# Altium footprint library thu vien thong.PcbLib: 106 footprints (part 4 of 7)
Each footprint in its own frame and in the unit in brackets; x right, y up, seen from the top. Pads: shape width x height; smd on the part's side, far side on the other; paste and mask are expansions set on the pad; w line width, h text height; cw(c..) or ccw(c..) is an arc to the next point about the centre after c.
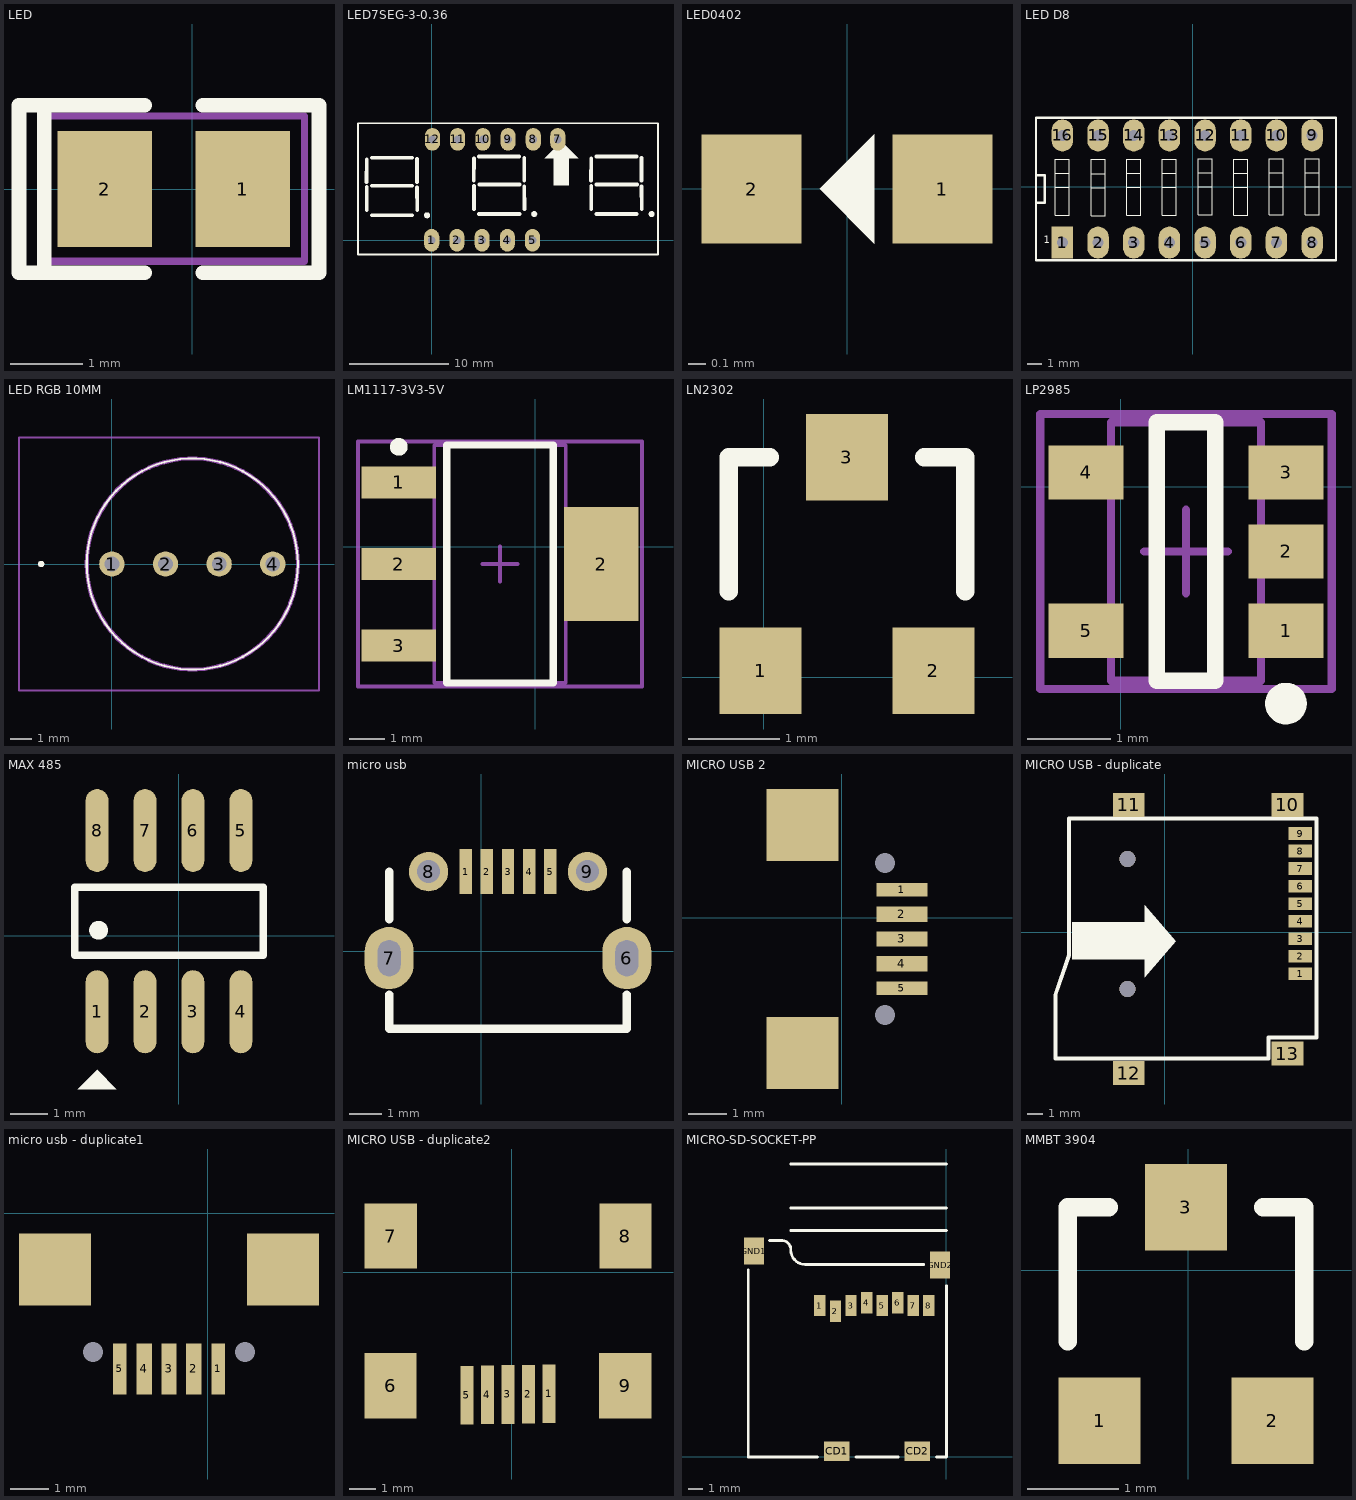
[diagram p3: the footprints below, top view; thin cyan lines are the x and y axes]

## LED [mm]
pads (2):
  rect 1.3x1.6 smd: 1(0.694,0.006) 2(-1.206,0.006)
Top Overlay:
  lines w0.2: -2.036,-1.144 -2.036,1.156 ; -0.656,-1.144 -2.386,-1.144 -2.386,1.156 -0.656,1.156 ; 0.144,-1.144 1.744,-1.144 1.744,1.156 0.144,1.156
Mechanical 13:
  lines w0.1: -2.057,-0.991 -2.057,1.009 1.543,1.009 1.543,-0.991 -2.057,-0.991
3D body: height 1.14, standoff 0.61, extent -0.953,-0.635 0.445,0.635
3D body: height 0.61, standoff 0, extent -1.333,-0.635 0.826,0.635

## LED7SEG-3-0.36 [mil]
height 300
pads (11):
  oval 60x90 hole 31: 1(0,0) 2(100,0) 3(200,0) 4(300,0) 5(400,0) 7(500,400) 8(402.95,400) 9(302.95,400) 10(202.95,400) 11(102.95,400) 12(2.95,400)
Top Overlay:
  circle w12: c872.27,103.94 r6
  circle w12: c-18.48,99.02 r6
  circle w12: c406.72,103.94 r6
  region: 447.72,324.94 513.72,390.94 515.72,390.94 580.72,325.94 580.72,324.94 543.72,324.94 543.72,218.94 484.72,218.94 484.72,324.94
  lines w7: -292.32,-57.09 -292.32,463.58 897.64,463.58
  lines w7.01: -292.32,-57.09 897.64,-57.09 897.64,463.58
  lines w15: -258.46,231.42 -257.87,319.88 ; -237.76,326.77 -77.76,326.77 ; -236.77,216.54 -76.77,216.54 ; -58.46,231.42 -58.07,321.85 ; 166.73,236.34 167.32,324.8 ; 187.44,331.69 347.44,331.69 ; 188.43,221.46 348.43,221.46 ; 366.73,236.34 367.13,326.77 ; 632.28,236.34 632.87,324.8 ; 652.99,331.69 812.99,331.69 ; 653.98,221.46 813.98,221.46 ; 832.28,236.34 832.68,326.77 ; -257.48,119.02 -257.48,210.63 ; -257.48,119.02 -257.48,210.63 ; -257.48,119.02 -257.48,210.63 ; -257.48,119.02 -257.48,210.63 ; -58.07,209.65 -57.48,119.02 ; -58.07,209.65 -57.48,119.02 ; -58.07,209.65 -57.48,119.02 ; -58.07,209.65 -57.48,119.02 ; 167.72,123.94 167.72,215.55 ; 167.72,123.94 167.72,215.55 ; 167.72,123.94 167.72,215.55 ; 167.72,123.94 167.72,215.55 ; 367.13,214.57 367.72,123.94 ; 367.13,214.57 367.72,123.94 ; 367.13,214.57 367.72,123.94 ; 367.13,214.57 367.72,123.94 ; 633.27,123.94 633.27,215.55 ; 633.27,123.94 633.27,215.55 ; 633.27,123.94 633.27,215.55 ; 633.27,123.94 633.27,215.55 ; 832.68,214.57 833.27,123.94 ; 832.68,214.57 833.27,123.94 ; 832.68,214.57 833.27,123.94 ; 832.68,214.57 833.27,123.94 ; -237.48,99.02 -77.48,99.02 -237.48,99.02 ; 187.72,103.94 347.72,103.94 187.72,103.94 ; 653.27,103.94 813.27,103.94 653.27,103.94
3D body "SOCKET6.stp": height 276.19, standoff -117.51, extent -52.76,350.59 547.24,450.59
3D body "SOCKET6.stp": height 276.19, standoff -117.51, extent -50,-44.99 550,55.01

## LED0402 [mil]
pads (2):
  rect 22x24 smd: 1(21,0) 2(-21,0)
Top Overlay:
  region: 6,-12 6,12 -6,0
3D body "User Library-led_0402.STEP": height 17.72, standoff 0, extent -19.88,-10 19.88,9.69

## LED D8 [mil]
pads (16):
  rect 60x90 hole 31.5: 1(-365,-156)
  oval 60x90 hole 31.5: 2(-265,-156) 3(-165,-156) 4(-65,-156) 5(35,-156) 6(135,-156) 7(235,-156) 8(335,-156) 9(335,144) 10(235,144) 11(135,144) 12(35,144) 13(-65,144) 14(-165,144) 15(-265,144) 16(-365,144)
Top Overlay:
  lines w1.5: -384.69,-1 -345.31,-1 ; -384.69,38.37 -345.31,38.37 ; -284.69,-2 -245.31,-2 ; -284.69,37.37 -245.31,37.37 ; -184.69,-1 -145.31,-1 ; -184.69,38.37 -145.31,38.37 ; -84.69,-1 -45.31,-1 ; -84.69,38.37 -45.31,38.37 ; 15.31,0 54.69,0 ; 15.31,39.37 54.69,39.37 ; 115.31,-1 154.69,-1 ; 115.31,38.37 154.69,38.37 ; 215.31,0 254.69,0 ; 215.31,39.37 254.69,39.37 ; 315.31,0 354.69,0 ; 315.31,39.37 354.69,39.37 ; -384.69,-79.74 -345.31,-79.74 -345.31,77.74 -384.69,77.74 -384.69,-79.74 ; -284.69,-80.74 -245.31,-80.74 -245.31,76.74 -284.69,76.74 -284.69,-80.74 ; -184.69,-79.74 -145.31,-79.74 -145.31,77.74 -184.69,77.74 -184.69,-79.74 ; -84.69,-79.74 -45.31,-79.74 -45.31,77.74 -84.69,77.74 -84.69,-79.74 ; 15.31,-78.74 54.69,-78.74 54.69,78.74 15.31,78.74 15.31,-78.74 ; 115.31,-79.74 154.69,-79.74 154.69,77.74 115.31,77.74 115.31,-79.74 ; 215.31,-78.74 254.69,-78.74 254.69,78.74 215.31,78.74 215.31,-78.74 ; 315.31,-78.74 354.69,-78.74 354.69,78.74 315.31,78.74 315.31,-78.74
  lines w7: -439,-86.5 -439,78 ; -439,-45 -414,-45 -414,33 -438,33 -439,34 ; -439,-31 -439,-205 -438,-206 402,-206 402,194 -439,194 -439,19
  text "1" at -417,-158 h20
3D body "SW3dPS-DIP SWITCH 8 POS CTS 206.STEP": height 324.8, standoff -137.8, extent -457.91,-196 427.91,189.04

## LED RGB 10MM [mm]
pads (4):
  round 1.2 hole 0.7: 1(0,0) 2(2.54,0) 3(5.08,0) 4(7.62,0)
Top Overlay:
  lines w0.1: -1.19,0 cw(c3.81,0) 8.81,0 cw(c3.81,0) -1.19,0
  lines w0.2: -3.4,0 ccw(c-3.35,0) -3.3,0 ; -3.4,0 cw(c-3.35,0) -3.3,0 ; -3.4,0 ccw(c-3.35,0) -3.3,0
Mechanical 13:
  lines w0.2: -1.19,0 cw(c3.81,0) 8.81,0 cw(c3.81,0) -1.19,0
Mechanical 15:
  lines w0.1: -4.4,-6 -4.4,6 9.81,6 9.81,-6 -4.4,-6
3D body "COM-11120.stp": height 13.1, standoff -5, extent -1.19,-5 8.81,5

## LM1117-3V3-5V [mm]
pads (4):
  rect 2.1x0.9 smd: 1(-3.841,1.817) 2(-3.841,-0.483) 3(-3.841,-2.783)
  rect 2.1x3.2 smd: 2(1.859,-0.483)
Top Overlay:
  circle w0.25: c-3.841,2.817 r0.125
  lines w0.2: -2.491,-3.833 -2.491,2.867 0.509,2.867 0.509,-3.833 -2.491,-3.833
Mechanical 13:
  lines w0.1: -2.841,-3.833 -2.841,2.867 0.859,2.867 0.859,-3.833 -2.841,-3.833
Mechanical 15:
  lines w0.1: -1.491,-0.483 -0.491,-0.483 ; -0.991,-0.983 -0.991,0.017 ; -4.991,-3.933 -4.991,2.967 3.009,2.967 3.009,-3.933 -4.991,-3.933
3D body "User Library-SOT-223-4.STEP": height 1.65, standoff 0, extent -4.534,-3.733 2.553,2.767

## LN2302 [mm]
pads (3):
  rect 0.9x0.95 smd: 1(-0.036,0.07) 2(1.864,0.07) 3(0.914,2.42)
Top Overlay:
  lines w0.2: -0.386,0.945 -0.386,2.42 0.064,2.42 ; 1.764,2.42 2.214,2.42 2.214,0.945
3D body "SW3DPS-SOT-23-DEFAULT.step": height 1.08, standoff -0.02, extent -0.586,-0.005 2.414,2.495

## LP2985 [mm]
pads (5):
  rect 0.9x0.65 smd: 1(1.985,-1.728) 2(1.985,-0.778) 3(1.985,0.172) 4(-0.415,0.172) 5(-0.415,-1.728)
Top Overlay:
  circle w0.25: c1.985,-2.603 r0.125
  lines w0.2: 0.435,-2.328 0.435,0.772 1.135,0.772 1.135,-2.328 0.435,-2.328
Mechanical 13:
  lines w0.1: -0.115,-2.328 1.685,-2.328 1.685,0.772 -0.115,0.772 -0.115,-2.328
Mechanical 15:
  lines w0.1: 0.285,-0.778 1.285,-0.778 ; 0.785,-1.278 0.785,-0.278 ; -0.965,-2.428 2.535,-2.428 2.535,0.872 -0.965,0.872 -0.965,-2.428
3D body: height 1.45, standoff 0, extent -0.115,-2.328 1.685,0.772

## MAX 485 [mm]
pads (8):
  oval 0.6x2.2 smd: 1(-2.159,-2.019) 2(-0.889,-2.019) 3(0.381,-2.019) 4(1.651,-2.019) 5(1.651,2.781) 6(0.381,2.781) 7(-0.889,2.781) 8(-2.159,2.781)
Top Overlay:
  circle w0.25: c-2.12,0.14 r0.125
  region: -1.651,-4.064 -2.159,-3.556 -2.667,-4.064
  lines w0.2: -2.754,-0.519 2.246,-0.519 2.246,1.281 -2.754,1.281 -2.754,-0.519
3D body "User Library-SOIC-8.STEP": height 1.75, standoff 0, extent -2.743,-2.549 2.257,3.463

## micro usb [mil]
pads (9):
  rect 15x54 smd: 1(-19,96) 2(6.5,96) 3(32,96) 4(57.5,96) 5(83,96)
  oval 59.06x74.8 hole 27.56 slot 43.31 at 90 deg: 6(175,-8) 7(-111,-8)
  round 47.24 hole 27.5: 8(-63.5,96) 9(127.5,96)
Top Overlay:
  lines w10: -110.72,-51.72 -110.72,-92.98 174.72,-92.98 174.72,-51.72 ; -110.72,38.72 -110.72,96 ; 174.72,38.72 174.72,96
3D body "User Library-Micro USB-B_Molex_105017-0001.step": height 105.31, standoff -24.61, extent -129.41,-108.44 193.42,105.33

## MICRO USB 2 [mm]
pads (9):
  rect 1.35x0.35 smd: 1(1.589,0.741) 5(1.589,-1.859)
  rect 1.35x0.4 smd: 2(1.589,0.091) 3(1.589,-0.559) 4(1.589,-1.209)
  rect 1.9x1.9 smd: ""(-1.031,-3.559) ""(-1.031,2.441)
  rect 0x0 hole 0.525: ""(1.139,-2.559) ""(1.139,1.441)
3D body "User Library-MicroUSB-B_Molex_105017-0001.STEP": height 2.68, standoff -0.63, extent -3.441,-4.659 1.989,3.541

## MICRO USB - duplicate [mm]
pads (13):
  rect 1.5x0.8 smd: 1(8.494,-2.616) 2(8.494,-1.516) 3(8.494,-0.416) 4(8.494,0.684) 5(8.494,1.784) 6(8.494,2.884) 7(8.494,3.984) 8(8.494,5.084) 9(8.494,6.184)
  rect 2x1.5 smd: 10(7.69,7.976) 11(-2.261,7.976) 12(-2.261,-8.839) 13(7.69,-7.62)
via -2.337,4.572 diameter 1 hole 1
via -2.337,-3.581 diameter 1 hole 1
Top Overlay:
  region: -5.791,0.61 -5.791,-1.702 -1.219,-1.702 -1.245,-1.676 -1.245,-2.845 0.686,-0.559 -1.245,1.676 -1.245,0.61
  lines w0.254: -6.871,-7.925 6.49,-7.925 6.49,-6.604 9.525,-6.604 9.525,7.112 -6.007,7.112 -6.007,-1.448 -6.871,-3.952 -6.871,-7.925
3D body "User Library-microsd card.step": height 1.2, standoff 0.2, extent -9.169,-5.862 5.831,5.15
3D body: height 1.85, standoff 0, extent -6.871,-7.925 8.014,7.112

## micro usb - duplicate1 [mm]
pads (9):
  rect 0.35x1.35 smd: 1(0.284,-4.104) 5(-2.316,-4.104)
  rect 0.4x1.35 smd: 2(-0.366,-4.104) 3(-1.016,-4.104) 4(-1.666,-4.104)
  rect 1.9x1.9 smd: ""(-4.016,-1.484) ""(1.984,-1.484)
  rect 0x0 hole 0.525: ""(-3.016,-3.654) ""(0.984,-3.654)
3D body "User Library-MicroUSB-B_Molex_105017-0001.STEP": height 2.68, standoff -0.63, extent -5.116,-4.504 3.084,0.926

## MICRO USB - duplicate2 [mm]
pads (9):
  rect 0.5x2.25 smd: 1(1.425,-4.655) 2(0.637,-4.667) 3(-0.15,-4.68) 4(-0.937,-4.693) 5(-1.725,-4.706)
  rect 2x2.5 smd: 6(-4.65,-4.35) 7(-4.646,1.39) 8(4.354,1.39) 9(4.35,-4.35)
3D body "User Library-USB_mini_B.step": height 3.95, standoff -1, extent -5.5,-5.023 5.2,4.177

## MICRO-SD-SOCKET-PP [mm]
pads (12):
  rect 0.8x1.5 smd: 1(-8.94,10.7) 2(-7.84,10.3) 3(-6.74,10.7) 4(-5.64,10.9) 5(-4.54,10.7) 6(-3.44,10.9) 7(-2.34,10.7) 8(-1.24,10.7)
  rect 1.8x1.4 smd: CD1(-7.75,0.4) CD2(-2.05,0.4)
  rect 1.4x1.9 smd: GND1(-13.6,14.55) GND2(-0.45,13.55)
Top Overlay:
  lines w0.203: -14,13.2 -14,0 -9.1,0 ; -12.5,15.3 -11.7,15.3 cw(c-11.65,14.65) -11,14.6 ccw(c-9.975,14.625) -10,13.6 -1.6,13.6 ; -11,16 0,16 ; -11,17.6 0,17.6 ; -11,20.7 0,20.7 ; -6.4,0 -3.4,0 ; -0.7,0 0,0 0,12.1

## MMBT 3904 [mm]
pads (3):
  rect 0.9x0.95 smd: 1(-0.975,-1.658) 2(0.925,-1.658) 3(-0.025,0.692)
Top Overlay:
  lines w0.2: -1.325,-0.783 -1.325,0.692 -0.875,0.692 ; 0.825,0.692 1.275,0.692 1.275,-0.783
3D body "SW3DPS-SOT-23-DEFAULT.step": height 1.08, standoff -0.02, extent -1.525,-1.733 1.475,0.767